# Altium footprint library Lib_001.PcbLib: 429 footprints (part 12 of 28)
Each footprint in its own frame and in the unit in brackets; x right, y up, seen from the top. Pads: shape width x height; smd on the part's side, far side on the other; paste and mask are expansions set on the pad; w line width, h text height; cw(c..) or ccw(c..) is an arc to the next point about the centre after c.
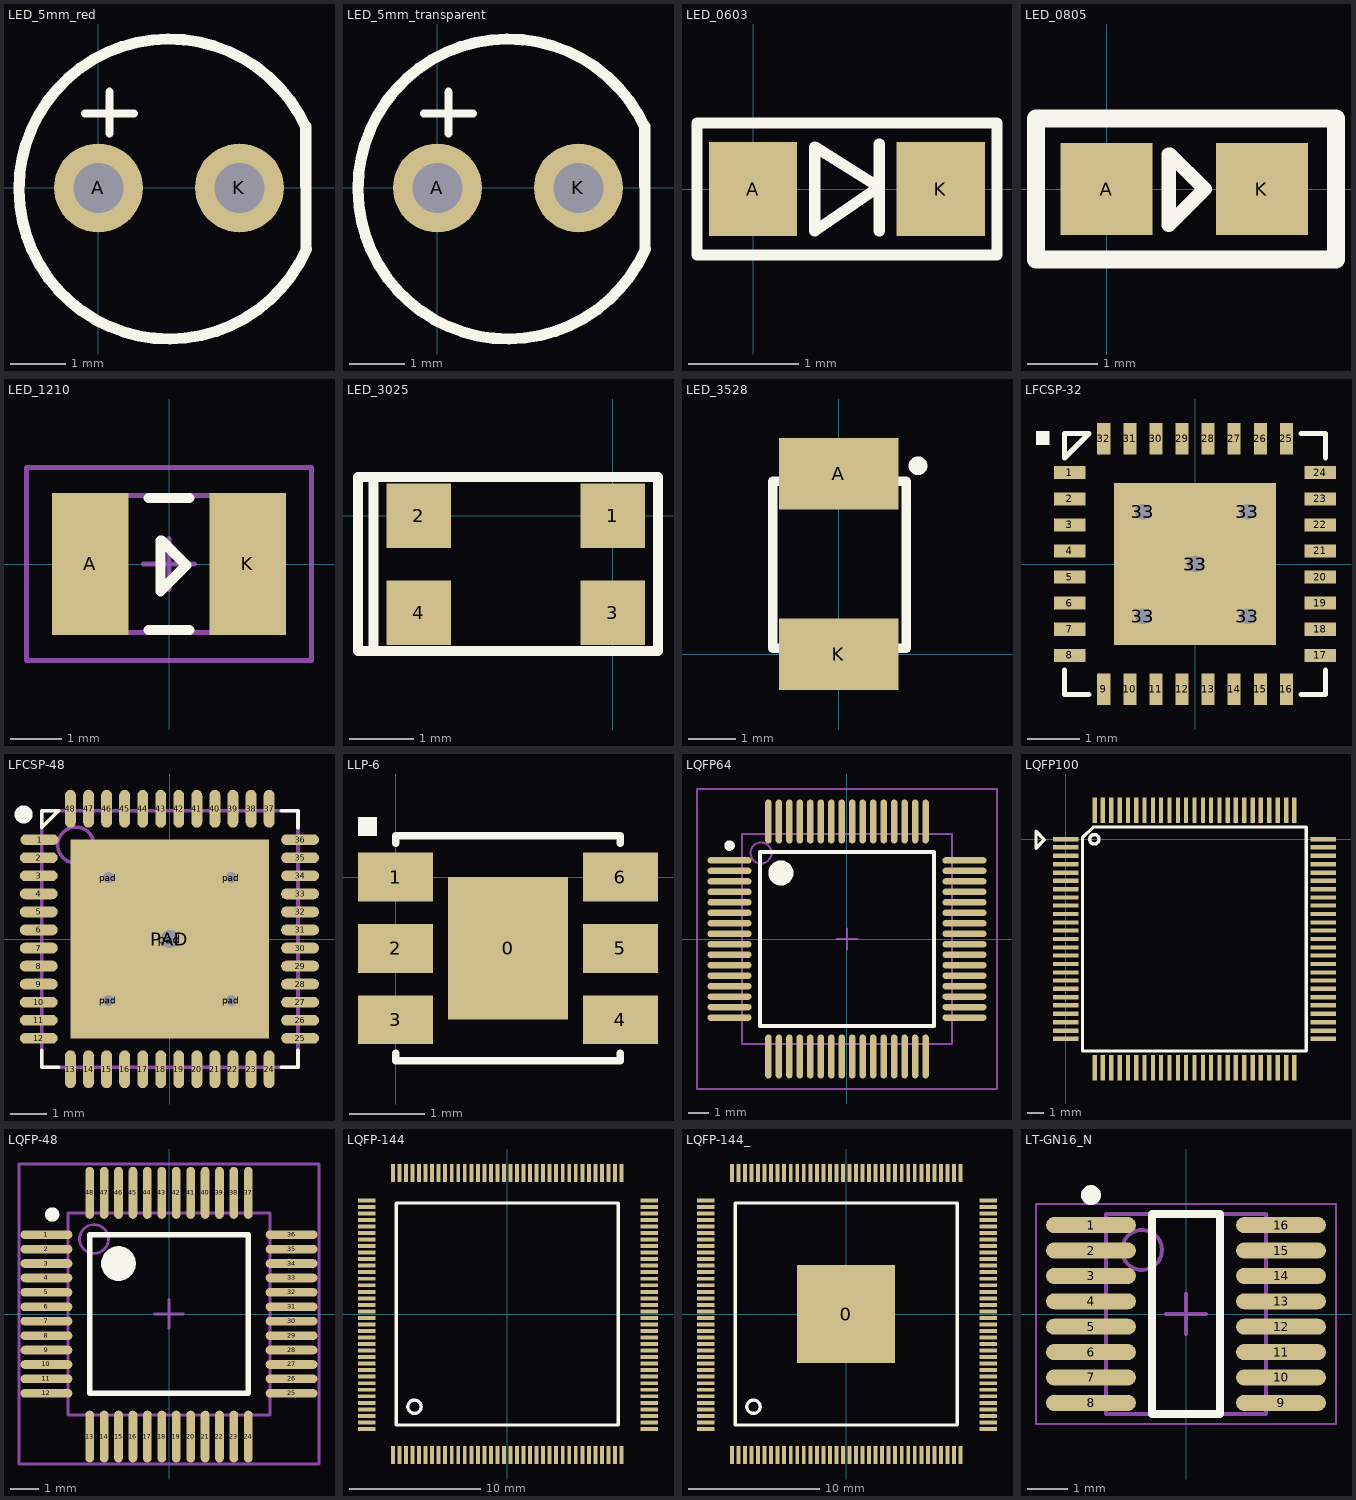
[diagram p11: the footprints below, top view; thin cyan lines are the x and y axes]

## LED_5mm_red [mm]
height 20
pads (2):
  round 1.6 hole 0.9: A(0,0) K(2.54,0)
Top Overlay:
  lines w0.15: -0.24,1.34 0.64,1.34 ; 0.2,0.98 0.2,1.73
  lines w0.2: 3.729,1.097 ccw(c1.271,-0.02) 3.745,-1.104
  lines w0.203: 3.735,1.111 3.736,-1.1
3D body "User Library-LED5ON-Red.step": height 10.5, standoff -3, extent -1.7,-3 3.8,3

## LED_5mm_transparent [mm]
height 20
pads (2):
  round 1.6 hole 0.9: A(0,0) K(2.54,0)
Top Overlay:
  lines w0.15: -0.24,1.34 0.64,1.34 ; 0.2,0.98 0.2,1.73
  lines w0.2: 3.729,1.097 ccw(c1.271,-0.02) 3.745,-1.104
  lines w0.203: 3.735,1.111 3.736,-1.1
3D body "User Library-LEDd5C.STEP": height 8.61, standoff -6.19, extent -1.707,-2.969 3.713,3.051

## LED_0603 [mm]
height 0.5
pads (2):
  rect 0.8x0.85 smd: A(0,0) K(1.702,0)
Top Overlay:
  lines w0.1: 1.143,-0.381 1.143,0.406 ; -0.508,-0.6 2.21,-0.6 2.21,0.6 -0.508,0.6 -0.508,-0.6 ; 0.559,-0.381 1.138,0.019 0.559,0.381 0.559,-0.381
3D body "User Library-LED SMD0603.step": height 0.68, standoff 0, extent 0,-0.362 1.65,0.363

## LED_0805 [mm]
height 0.5
pads (2):
  rect 1.3x1.3 smd: A(0,0) K(2.2,0)
Top Overlay:
  lines w0.2: 0.88,-0.51 1.39,0 0.9,0.49 0.88,0.49 0.88,-0.51
  lines w0.254: -1,-1 3.25,-1 3.25,1 -1,1 -1,-1
3D body: height 1, standoff 0, extent 0.1,-0.65 2.1,0.65
3D body: height 1, standoff 0, extent -0.35,-0.65 0.1,0.65
3D body: height 1, standoff 0, extent 2.1,-0.65 2.6,0.65

## LED_1210 [mm] "Chip Capacitor, Body 3.2x2.5mm, IPC Low Density"
height 1.5
pads (2):
  rect 1.5x2.8 smd: A(-1.55,0) K(1.55,0)
Top Overlay:
  lines w0.2: -0.4,-1.3 0.4,-1.3 ; -0.4,1.3 0.4,1.3 ; -0.17,0.465 -0.17,-0.535 0.34,-0.025 -0.15,0.465
Mechanical 13:
  lines w0.1: -1.7,-1.35 -1.7,1.35 1.7,1.35 1.7,-1.35 -1.7,-1.35
Mechanical 15:
  lines w0.1: -0.5,0 0.5,0 ; 0,-0.5 0,0.5 ; -2.8,-1.9 -2.8,1.9 2.8,1.9 2.8,-1.9 -2.8,-1.9
3D body "User Library-led_1210.step": height 1.1, standoff -0.05, extent -1.62,-1.35 1.62,1.35

## LED_3025 [mm]
pads (4):
  rect 1x1 smd: 1(0,0) 2(-3,0) 3(0,-1.5) 4(-3,-1.5)
Top Overlay:
  lines w0.15: -3.7,-2.09 0.7,-2.09 0.7,0.6 -3.7,0.6 ; -3.7,-2.09 -3.7,0.6 ; -3.7,-2.09 -3.94,-2.09 -3.94,0.6 -3.7,0.6
3D body "User Library-led_bicolor_kpb-3025.STEP": height 1.1, standoff 0, extent -3.04,-1.99 -0.04,0.51

## LED_3528 [mm]
pads (2):
  rect 2.5x1.5 smd: A(0,3.792) K(0,0)
Top Overlay:
  circle w0.254: c1.663,3.956 r0.069
  lines w0.2: -1.385,0.128 -1.385,3.628 1.415,3.628 1.415,0.128 -1.385,0.128
3D body "User Library-Led_3528_SingleColor.step": height 1.9, standoff 0, extent -1.439,0.146 1.361,3.646

## LFCSP-32 [mm]
height 1
pads (38):
  rect 0.6x0.25 smd: 1(-2.4,1.75) 2(-2.4,1.25) 3(-2.4,0.75) 4(-2.4,0.25) 5(-2.4,-0.25) 6(-2.4,-0.75) 7(-2.4,-1.25) 8(-2.4,-1.75) 17(2.401,-1.75) 18(2.401,-1.25) 19(2.401,-0.75) 20(2.401,-0.25) 21(2.401,0.25) 22(2.401,0.75) 23(2.401,1.25) 24(2.401,1.75)
  rect 0.25x0.6 smd: 9(-1.75,-2.4) 10(-1.25,-2.4) 11(-0.75,-2.4) 12(-0.25,-2.4) 13(0.25,-2.4) 14(0.75,-2.4) 15(1.25,-2.4) 16(1.75,-2.4) 25(1.75,2.4) 26(1.25,2.4) 27(0.75,2.4) 28(0.25,2.4) 29(-0.25,2.4) 30(-0.75,2.4) 31(-1.25,2.4) 32(-1.75,2.4)
  round 0.6 hole 0.3: 33(-1,-1) 33(-1,1) 33(0,0) 33(1,-1) 33(1,1)
  rect 3.1x3.1 smd: 33(0,0)
Top Overlay:
  region: -3.048,2.54 -2.794,2.54 -2.794,2.286 -3.048,2.286
  lines w0.1: -2.5,-2.032 -2.5,-2.5 -2.032,-2.5 ; 2.032,-2.5 2.5,-2.5 2.5,-2.032 ; 2.032,2.5 2.5,2.5 2.5,2.032 ; -2.5,2.032 -2.5,2.5 -2.032,2.5 -2.5,2.032
3D body "User Library-MAX9984.STEP": height 0.74, standoff -0.01, extent -2.5,-2.5 2.5,2.5

## LFCSP-48 [mm] "48-Pin Thin Quad Flat Pack 0.5 mm Pitch, IPC Medium Density"
height 1.6
pads (54):
  oval 1.05x0.3 smd: 1(-3.607,2.75) 2(-3.627,2.25) 3(-3.627,1.75) 4(-3.627,1.25) 5(-3.627,0.75) 6(-3.627,0.25) 7(-3.627,-0.25) 8(-3.627,-0.75) 9(-3.627,-1.25) 10(-3.627,-1.75) 11(-3.627,-2.25) 12(-3.627,-2.75) 25(3.607,-2.75) 26(3.607,-2.25) 27(3.607,-1.75) 28(3.607,-1.25) 29(3.607,-0.75) 30(3.607,-0.25) 31(3.607,0.25) 32(3.607,0.75) 33(3.607,1.25) 34(3.607,1.75) 35(3.607,2.25) 36(3.607,2.75)
  oval 0.3x1.05 smd: 13(-2.75,-3.607) 14(-2.25,-3.607) 15(-1.75,-3.607) 16(-1.25,-3.607) 17(-0.75,-3.607) 18(-0.25,-3.607) 19(0.25,-3.607) 20(0.75,-3.607) 21(1.25,-3.607) 22(1.75,-3.607) 23(2.25,-3.607) 24(2.75,-3.607) 37(2.75,3.607) 38(2.25,3.607) 39(1.75,3.607) 40(1.25,3.607) 41(0.75,3.607) 42(0.25,3.607) 43(-0.25,3.607) 44(-0.75,3.607) 45(-1.25,3.607) 46(-1.75,3.607) 47(-2.25,3.607) 48(-2.75,3.607)
  round 0.6 hole 0.3: pad(-1.7,-1.7) pad(-1.7,1.7) pad(1.7,-1.7) pad(1.7,1.7)
  rect 5.5x5.5 smd: PAD(0,0)
  round 0.8 hole 0.5: pad(0,0)
Top Overlay:
  circle w0.25: c-4.05,3.45 r0.125
  lines w0.1: -3.55,-3.082 -3.55,-3.55 -3.082,-3.55 ; 3.082,-3.55 3.55,-3.55 3.55,-3.082 ; 3.082,3.55 3.55,3.55 3.55,3.082 ; -3.55,3.082 -3.55,3.55 -3.082,3.55 -3.55,3.082
Mechanical 13:
  circle w0.1: c-2.6,2.6 r0.5
  lines w0.1: -3.55,-3.55 3.55,-3.55 3.55,3.55 -3.55,3.55 -3.55,-3.55
Mechanical 15:
  lines w0.1: 0,-0.5 0,0.5
3D body "User Library-LFCSP 48-pin.step": height 0.84, standoff -0.01, extent -3.5,-3.5 3.5,3.5

## LLP-6 [mm] "6-Lead LLP Package"
height 0.8
pads (7):
  rect 1.6x1.9 smd: 0(1.5,-0.95)
  rect 1x0.65 smd: 1(0,0) 2(0,-0.95) 3(0,-1.9) 4(3,-1.9) 5(3,-0.95) 6(3,0)
Top Overlay:
  region: -0.5,0.8 -0.5,0.55 -0.25,0.55 -0.25,0.8
  lines w0.1: 0,-2.35 0,-2.45 1.5,-2.45 3,-2.45 3,-2.35 ; 0,0.45 0,0.55 0.5,0.55 3,0.55 3,0.45
3D body: height 0.8, standoff 0, extent 0,-2.45 3,0.55

## LQFP64 [mm] "Thin QFP, 64-Leads, Body 10x10mm, Pitch 0.5mm, IPC Low Density"
height 1.6
pads (64):
  oval 2.1x0.3 smd: 1(-5.6,3.75) 2(-5.6,3.25) 3(-5.6,2.75) 4(-5.6,2.25) 5(-5.6,1.75) 6(-5.6,1.25) 7(-5.6,0.75) 8(-5.6,0.25) 9(-5.6,-0.25) 10(-5.6,-0.75) 11(-5.6,-1.25) 12(-5.6,-1.75) 13(-5.6,-2.25) 14(-5.6,-2.75) 15(-5.6,-3.25) 16(-5.6,-3.75) 33(5.6,-3.75) 34(5.6,-3.25) 35(5.6,-2.75) 36(5.6,-2.25) 37(5.6,-1.75) 38(5.6,-1.25) 39(5.6,-0.75) 40(5.6,-0.25) 41(5.6,0.25) 42(5.6,0.75) 43(5.6,1.25) 44(5.6,1.75) 45(5.6,2.25) 46(5.6,2.75) 47(5.6,3.25) 48(5.6,3.75)
  oval 0.3x2.1 smd: 17(-3.75,-5.6) 18(-3.25,-5.6) 19(-2.75,-5.6) 20(-2.25,-5.6) 21(-1.75,-5.6) 22(-1.25,-5.6) 23(-0.75,-5.6) 24(-0.25,-5.6) 25(0.25,-5.6) 26(0.75,-5.6) 27(1.25,-5.6) 28(1.75,-5.6) 29(2.25,-5.6) 30(2.75,-5.6) 31(3.25,-5.6) 32(3.75,-5.6) 49(3.75,5.6) 50(3.25,5.6) 51(2.75,5.6) 52(2.25,5.6) 53(1.75,5.6) 54(1.25,5.6) 55(0.75,5.6) 56(0.25,5.6) 57(-0.25,5.6) 58(-0.75,5.6) 59(-1.25,5.6) 60(-1.75,5.6) 61(-2.25,5.6) 62(-2.75,5.6) 63(-3.25,5.6) 64(-3.75,5.6)
Top Overlay:
  circle w0.6: c-3.15,3.15 r0.3
  circle w0.25: c-5.6,4.45 r0.125
  lines w0.2: -4.15,-4.15 4.15,-4.15 4.15,4.15 -4.15,4.15 -4.15,-4.15
Mechanical 13:
  circle w0.1: c-4.1,4.1 r0.5
  lines w0.1: -5,-5 5,-5 5,5 -5,5 -5,-5
Mechanical 15:
  lines w0.1: -0.5,0 0.5,0 ; 0,-0.5 0,0.5 ; -7.15,-7.15 7.15,-7.15 7.15,7.15 -7.15,7.15 -7.15,-7.15
3D body "User Library-LQFP64_Grid_0_5.STEP": height 1.6, standoff 0, extent -5.98,-6 6.02,6

## LQFP100 [mil]
pads (100):
  rect 60x10 smd: 1(0,0) 2(0,-19) 3(0,-39) 4(0,-59) 5(0,-79) 6(0,-98) 7(0,-118) 8(0,-138) 9(0,-157) 10(0,-177) 11(0,-197) 12(0,-216) 13(0,-236) 14(0,-256) 15(0,-275) 16(0,-295) 17(0,-315) 18(0,-334) 19(0,-354) 20(0,-374) 21(0,-393) 22(0,-413) 23(0,-433) 24(0,-453) 25(0,-472) 51(610,-472) 52(610,-453) 53(610,-433) 54(610,-413) 55(610,-393) 56(610,-374) 57(610,-354) 58(610,-334) 59(610,-315) 60(610,-295) 61(610,-275) 62(610,-256) 63(610,-236) 64(610,-216) 65(610,-197) 66(610,-177) 67(610,-157) 68(610,-138) 69(610,-118) 70(610,-98) 71(610,-79) 72(610,-59) 73(610,-39) 74(610,-19) 75(610,0)
  rect 10x60 smd: 26(69,-541) 27(88,-541) 28(108,-541) 29(128,-541) 30(148,-541) 31(167,-541) 32(187,-541) 33(207,-541) 34(226,-541) 35(246,-541) 36(266,-541) 37(285,-541) 38(305,-541) 39(325,-541) 40(344,-541) 41(364,-541) 42(384,-541) 43(403,-541) 44(423,-541) 45(443,-541) 46(462,-541) 47(482,-541) 48(502,-541) 49(522,-541) 50(541,-541) 76(541,69) 77(522,69) 78(502,69) 79(482,69) 80(462,69) 81(443,69) 82(423,69) 83(403,69) 84(384,69) 85(364,69) 86(344,69) 87(325,69) 88(305,69) 89(285,69) 90(266,69) 91(246,69) 92(226,69) 93(207,69) 94(187,69) 95(167,69) 96(148,69) 97(128,69) 98(108,69) 99(88,69) 100(69,69)
Top Overlay:
  circle w8: c68,0 r11.18
  lines w8: -70,-21 -50,-1 -70,19 -70,-21 ; 40,-501 40,4 65,29 570,29 570,-501 40,-501
3D body "User Library-lqfp-100.STEP": height 55.12, standoff -12.13, extent -9.84,-552.17 620.08,77.76

## LQFP-48 [mm] "48-Pin Thin Quad Flat Pack 0.5 mm Pitch, IPC Medium Density"
height 1.6
pads (48):
  oval 1.8x0.3 smd: 1(-4.25,2.75) 2(-4.25,2.25) 3(-4.25,1.75) 4(-4.25,1.25) 5(-4.25,0.75) 6(-4.25,0.25) 7(-4.25,-0.25) 8(-4.25,-0.75) 9(-4.25,-1.25) 10(-4.25,-1.75) 11(-4.25,-2.25) 12(-4.25,-2.75) 25(4.25,-2.75) 26(4.25,-2.25) 27(4.25,-1.75) 28(4.25,-1.25) 29(4.25,-0.75) 30(4.25,-0.25) 31(4.25,0.25) 32(4.25,0.75) 33(4.25,1.25) 34(4.25,1.75) 35(4.25,2.25) 36(4.25,2.75)
  oval 0.3x1.8 smd: 13(-2.75,-4.25) 14(-2.25,-4.25) 15(-1.75,-4.25) 16(-1.25,-4.25) 17(-0.75,-4.25) 18(-0.25,-4.25) 19(0.25,-4.25) 20(0.75,-4.25) 21(1.25,-4.25) 22(1.75,-4.25) 23(2.25,-4.25) 24(2.75,-4.25) 37(2.75,4.2) 38(2.25,4.2) 39(1.75,4.2) 40(1.25,4.2) 41(0.75,4.2) 42(0.25,4.2) 43(-0.25,4.2) 44(-0.75,4.2) 45(-1.25,4.2) 46(-1.75,4.2) 47(-2.25,4.2) 48(-2.75,4.2)
Top Overlay:
  circle w0.25: c-4.05,3.45 r0.125
  circle w0.6: c-1.75,1.75 r0.3
  lines w0.2: -2.75,-2.75 -2.75,2.75 2.75,2.75 2.75,-2.75 -2.75,-2.75
Mechanical 13:
  circle w0.1: c-2.6,2.6 r0.5
  lines w0.1: -3.5,-3.5 -3.5,3.5 3.5,3.5 3.5,-3.5 -3.5,-3.5
Mechanical 15:
  lines w0.1: -0.5,0 0.5,0 ; 0,-0.5 0,0.5 ; -5.2,-5.2 -5.2,5.2 5.2,5.2 5.2,-5.2 -5.2,-5.2
3D body "User Library-Quad50M48.step": height 1.56, standoff 0, extent -4.493,-4.503 4.507,4.497

## LQFP-144 [mm]
pads (144):
  rect 0.3x1.35 smd: 1(-8.75,-10.8) 2(-8.25,-10.8) 3(-7.75,-10.8) 4(-7.25,-10.8) 5(-6.75,-10.8) 6(-6.25,-10.8) 7(-5.75,-10.8) 8(-5.25,-10.8) 9(-4.75,-10.8) 10(-4.25,-10.8) 11(-3.75,-10.8) 12(-3.25,-10.8) 13(-2.75,-10.8) 14(-2.25,-10.8) 15(-1.75,-10.8) 16(-1.25,-10.8) 17(-0.75,-10.8) 18(-0.25,-10.8) 19(0.25,-10.8) 20(0.75,-10.8) 21(1.25,-10.8) 22(1.75,-10.8) 23(2.25,-10.8) 24(2.75,-10.8) 25(3.25,-10.8) 26(3.75,-10.8) 27(4.25,-10.8) 28(4.75,-10.8) 29(5.25,-10.8) 30(5.75,-10.8) 31(6.25,-10.8) 32(6.75,-10.8) 33(7.25,-10.8) 34(7.75,-10.8) 35(8.25,-10.8) 36(8.75,-10.8) 73(8.75,10.8) 74(8.25,10.8) 75(7.75,10.8) 76(7.25,10.8) 77(6.75,10.8) 78(6.25,10.8) 79(5.75,10.8) 80(5.25,10.8) 81(4.75,10.8) 82(4.25,10.8) 83(3.75,10.8) 84(3.25,10.8) 85(2.75,10.8) 86(2.25,10.8) 87(1.75,10.8) 88(1.25,10.8) 89(0.75,10.8) 90(0.25,10.8) 91(-0.25,10.8) 92(-0.75,10.8) 93(-1.25,10.8) 94(-1.75,10.8) 95(-2.25,10.8) 96(-2.75,10.8) 97(-3.25,10.8) 98(-3.75,10.8) 99(-4.25,10.8) 100(-4.75,10.8) 101(-5.25,10.8) 102(-5.75,10.8) 103(-6.25,10.8) 104(-6.75,10.8) 105(-7.25,10.8) 106(-7.75,10.8) 107(-8.25,10.8) 108(-8.75,10.8)
  rect 1.35x0.3 smd: 37(10.87,-8.8) 38(10.87,-8.3) 39(10.87,-7.8) 40(10.87,-7.3) 41(10.87,-6.8) 42(10.87,-6.3) 43(10.87,-5.8) 44(10.87,-5.3) 45(10.87,-4.8) 46(10.87,-4.3) 47(10.87,-3.8) 48(10.87,-3.3) 49(10.87,-2.8) 50(10.87,-2.3) 51(10.87,-1.8) 52(10.87,-1.3) 53(10.87,-0.8) 54(10.87,-0.3) 55(10.87,0.2) 56(10.87,0.7) 57(10.87,1.2) 58(10.87,1.7) 59(10.87,2.2) 60(10.87,2.7) 61(10.87,3.2) 62(10.87,3.7) 63(10.87,4.2) 64(10.87,4.7) 65(10.87,5.2) 66(10.87,5.7) 67(10.87,6.2) 68(10.87,6.7) 69(10.87,7.2) 70(10.87,7.7) 71(10.87,8.2) 72(10.87,8.7) 109(-10.75,8.7) 110(-10.75,8.2) 111(-10.75,7.7) 112(-10.75,7.2) 113(-10.75,6.7) 114(-10.75,6.2) 115(-10.75,5.7) 116(-10.75,5.2) 117(-10.75,4.7) 118(-10.75,4.2) 119(-10.75,3.7) 120(-10.75,3.2) 121(-10.75,2.7) 122(-10.75,2.2) 123(-10.75,1.7) 124(-10.75,1.2) 125(-10.75,0.7) 126(-10.75,0.2) 127(-10.75,-0.3) 128(-10.75,-0.8) 129(-10.75,-1.3) 130(-10.75,-1.8) 131(-10.75,-2.3) 132(-10.75,-2.8) 133(-10.75,-3.3) 134(-10.75,-3.8) 135(-10.75,-4.3) 136(-10.75,-4.8) 137(-10.75,-5.3) 138(-10.75,-5.8) 139(-10.75,-6.3) 140(-10.75,-6.8) 141(-10.75,-7.3) 142(-10.75,-7.8) 143(-10.75,-8.3) 144(-10.75,-8.8)
Top Overlay:
  circle w0.254: c-7.1,-7.1 r0.51
  lines w0.254: -8.5,-8.5 -8.5,8.5 8.5,8.5 8.5,-8.5 -8.5,-8.5
3D body "User Library-LQFP144-0_5.STEP": height 1.6, standoff 0.03, extent -10.886,-10.936 10.886,10.836

## LQFP-144_ [mm]
pads (145):
  rect 7.5x7.5 smd: 0(0,0)
  rect 0.3x1.35 smd: 1(-8.75,-10.8) 2(-8.25,-10.8) 3(-7.75,-10.8) 4(-7.25,-10.8) 5(-6.75,-10.8) 6(-6.25,-10.8) 7(-5.75,-10.8) 8(-5.25,-10.8) 9(-4.75,-10.8) 10(-4.25,-10.8) 11(-3.75,-10.8) 12(-3.25,-10.8) 13(-2.75,-10.8) 14(-2.25,-10.8) 15(-1.75,-10.8) 16(-1.25,-10.8) 17(-0.75,-10.8) 18(-0.25,-10.8) 19(0.25,-10.8) 20(0.75,-10.8) 21(1.25,-10.8) 22(1.75,-10.8) 23(2.25,-10.8) 24(2.75,-10.8) 25(3.25,-10.8) 26(3.75,-10.8) 27(4.25,-10.8) 28(4.75,-10.8) 29(5.25,-10.8) 30(5.75,-10.8) 31(6.25,-10.8) 32(6.75,-10.8) 33(7.25,-10.8) 34(7.75,-10.8) 35(8.25,-10.8) 36(8.75,-10.8) 73(8.75,10.8) 74(8.25,10.8) 75(7.75,10.8) 76(7.25,10.8) 77(6.75,10.8) 78(6.25,10.8) 79(5.75,10.8) 80(5.25,10.8) 81(4.75,10.8) 82(4.25,10.8) 83(3.75,10.8) 84(3.25,10.8) 85(2.75,10.8) 86(2.25,10.8) 87(1.75,10.8) 88(1.25,10.8) 89(0.75,10.8) 90(0.25,10.8) 91(-0.25,10.8) 92(-0.75,10.8) 93(-1.25,10.8) 94(-1.75,10.8) 95(-2.25,10.8) 96(-2.75,10.8) 97(-3.25,10.8) 98(-3.75,10.8) 99(-4.25,10.8) 100(-4.75,10.8) 101(-5.25,10.8) 102(-5.75,10.8) 103(-6.25,10.8) 104(-6.75,10.8) 105(-7.25,10.8) 106(-7.75,10.8) 107(-8.25,10.8) 108(-8.75,10.8)
  rect 1.35x0.3 smd: 37(10.87,-8.8) 38(10.87,-8.3) 39(10.87,-7.8) 40(10.87,-7.3) 41(10.87,-6.8) 42(10.87,-6.3) 43(10.87,-5.8) 44(10.87,-5.3) 45(10.87,-4.8) 46(10.87,-4.3) 47(10.87,-3.8) 48(10.87,-3.3) 49(10.87,-2.8) 50(10.87,-2.3) 51(10.87,-1.8) 52(10.87,-1.3) 53(10.87,-0.8) 54(10.87,-0.3) 55(10.87,0.2) 56(10.87,0.7) 57(10.87,1.2) 58(10.87,1.7) 59(10.87,2.2) 60(10.87,2.7) 61(10.87,3.2) 62(10.87,3.7) 63(10.87,4.2) 64(10.87,4.7) 65(10.87,5.2) 66(10.87,5.7) 67(10.87,6.2) 68(10.87,6.7) 69(10.87,7.2) 70(10.87,7.7) 71(10.87,8.2) 72(10.87,8.7) 109(-10.75,8.7) 110(-10.75,8.2) 111(-10.75,7.7) 112(-10.75,7.2) 113(-10.75,6.7) 114(-10.75,6.2) 115(-10.75,5.7) 116(-10.75,5.2) 117(-10.75,4.7) 118(-10.75,4.2) 119(-10.75,3.7) 120(-10.75,3.2) 121(-10.75,2.7) 122(-10.75,2.2) 123(-10.75,1.7) 124(-10.75,1.2) 125(-10.75,0.7) 126(-10.75,0.2) 127(-10.75,-0.3) 128(-10.75,-0.8) 129(-10.75,-1.3) 130(-10.75,-1.8) 131(-10.75,-2.3) 132(-10.75,-2.8) 133(-10.75,-3.3) 134(-10.75,-3.8) 135(-10.75,-4.3) 136(-10.75,-4.8) 137(-10.75,-5.3) 138(-10.75,-5.8) 139(-10.75,-6.3) 140(-10.75,-6.8) 141(-10.75,-7.3) 142(-10.75,-7.8) 143(-10.75,-8.3) 144(-10.75,-8.8)
Top Overlay:
  circle w0.254: c-7.1,-7.1 r0.51
  lines w0.254: -8.5,-8.5 8.5,-8.5 8.5,8.5 -8.5,8.5 -8.5,-8.5
3D body "User Library-LQFP144-0_5.STEP": height 1.6, standoff 0.03, extent -10.886,-10.936 10.886,10.836

## LT-GN16_N [mm] "SOP, 16-Leads, Body 4.89x3.9mm, Pitch 0.635mm, , IPC Medium Density"
height 1.75
pads (16):
  oval 2.25x0.4 smd: 1(-2.375,2.222) 2(-2.375,1.587) 3(-2.375,0.953) 4(-2.375,0.318) 5(-2.375,-0.318) 6(-2.375,-0.953) 7(-2.375,-1.587) 8(-2.375,-2.222) 9(2.375,-2.222) 10(2.375,-1.587) 11(2.375,-0.953) 12(2.375,-0.318) 13(2.375,0.318) 14(2.375,0.953) 15(2.375,1.587) 16(2.375,2.222)
Top Overlay:
  circle w0.25: c-2.375,2.973 r0.125
  lines w0.2: -0.85,-2.5 0.85,-2.5 0.85,2.5 -0.85,2.5 -0.85,-2.5
Mechanical 13:
  circle w0.1: c-1.1,1.6 r0.5
  lines w0.1: -2,-2.5 2,-2.5 2,2.5 -2,2.5 -2,-2.5
Mechanical 15:
  lines w0.05: -3.75,-2.75 3.75,-2.75 3.75,2.75 -3.75,2.75 -3.75,-2.75
  lines w0.1: -0.5,0 0.5,0 ; 0,-0.5 0,0.5
3D body: height 1.75, standoff 0.1, extent -2,-2.5 2,2.5